# Altium schematic symbol library AliPadash.SchLib: 1186 symbols (part 3 of 6) (continued)
## LA7221 (continued)
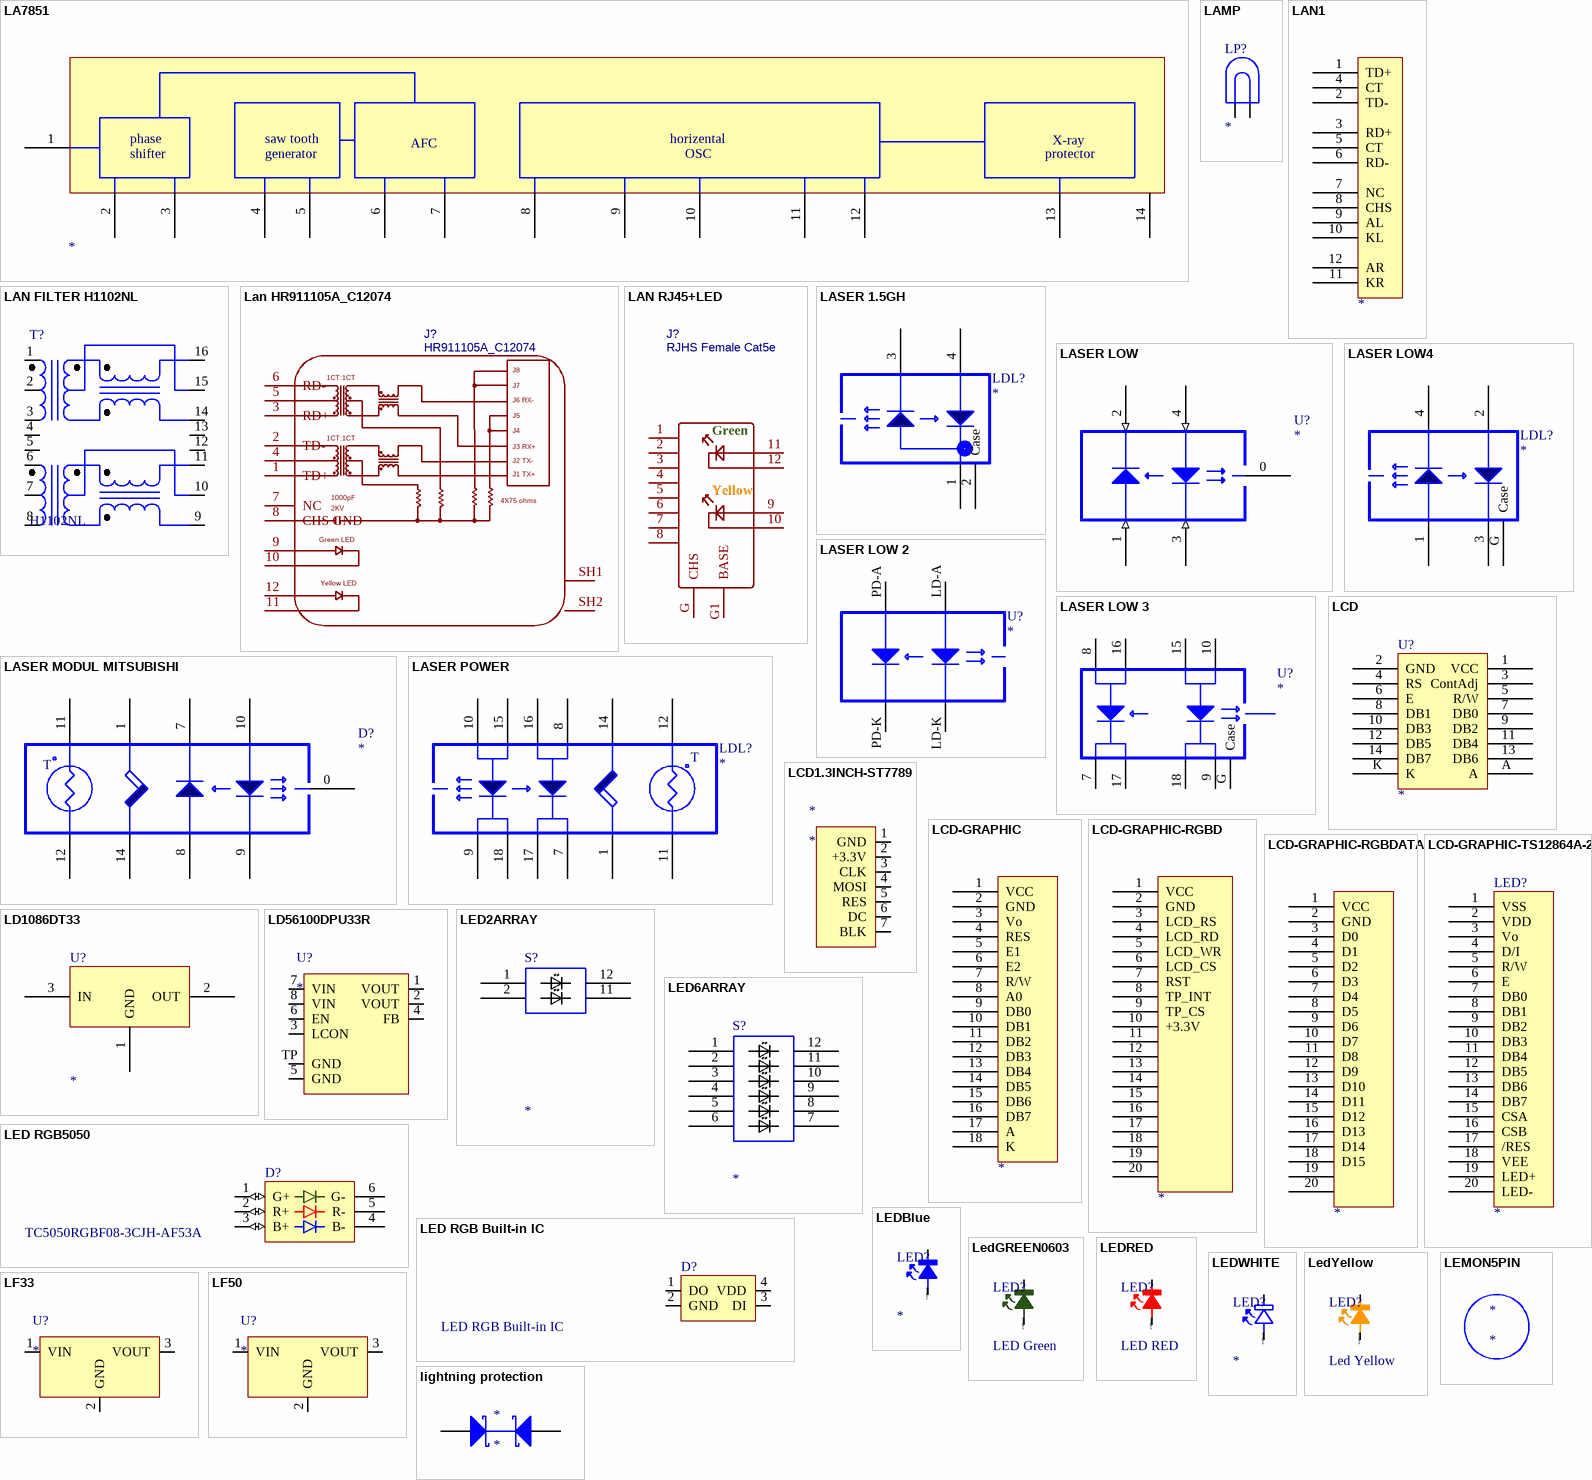
[diagram p37: symbols LA7851 to lightning protection]

## LA7851
designator ?
pins: 1, 2, 3, 4, 5, 6, 7, 8, 9, 10, 11, 12, 13, 14
text: phase; saw tooth; horizental; X-ray; AFC; shifter; generator; OSC; protector

## LAMP
designator LP?
pins: 1, 2

## LAN1
designator ?
pins: 1 TD+, 2 TD-, 3 RD+, 4 CT, 5 CT, 6 RD-, 7 NC, 8 CHS, 9 AL, 10 KL, 11 KR, 12 AR

## LAN FILTER H1102NL
designator T?, comment H1102NL
MAFC: H1102NLT; JLC: C18584
footprint 10-100TRANS
pins: 1, 2, 3, 4, 5, 6, 7, 8, 9, 10, 11, 12, 13, 14, 15, 16

## Lan HR911105A_C12074
designator J?, comment HR911105A_C12074
Manufacturer: HANRUN(汉仁); Supplier: LCSC; Manufacturer Part: HR911105A; Supplier Part: C12074; JLCPCB Part Class: Extended Part; spicePre: J; spiceSymbolName: HR911105A_C12074; JLC: C12074; MAFC: HR911105A
footprint RJ45-TH_HR911105A (Footprint not found)
pins: 1 TD+, 2 TD-, 3 RD+, 4, 5, 6 RD-, 7 NC, 8 CHS GND, 9, 10, 11, 12, SH1, SH2
text: J8; 1CT:1CT; J7; J6 RX-; J5; J4; J3 RX+; J2 TX-; J1 TX+; 1000pF; 4X75 ohms; 2KV; Green LED; Yellow LED

## LAN RJ45+LED
designator J?, comment RJHS Female Cat5e
Manufacturer: CONNFLY; Manufacturer Part: DS1128-09-S8B8X; Supplier: LCSC; Supplier Part: C86578; JLCPCB Part Class: Extended Part; spicePre: R; spiceSymbolName: DS1128-09-S8B8X; MAFC: DS1128-09-S8B8X; JLC: C86578
footprint RJ45+LED1
pins: 1, 2, 3, 4, 5, 6, 7, 8, 9, 10, 11, 12, G CHS, G1 BASE
text: Green; Yellow

## LASER 1.5GH
designator LDL?
footprint LDHP2
pins: 1, 2 Case, 3, 4

## LASER LOW
designator U?
pins: 0, 1 PA (in), 2 PH-K (in), 3 KATODE (in), 4 ANODE (in)

## LASER LOW4
designator LDL?
footprint LDHP2
pins: 1, 2, 3, 4, G Case

## LASER LOW 2
designator U?
pins: LD-A, LD-K, PD-A, PD-K

## LASER LOW 3
designator U?
pins: 7, 8, 9, 10, 15 LD-A, 16 PD-K, 17 PD-A, 18 LD-K, G Case

## LASER MODUL MITSUBISHI
designator D?
pins: 0, 1 +COLLER, 7 CATHODE PH.DET, 8 ANODE PH.DET, 9 CATHODE LASER, 10 ANODE LASER, 11 TERMISTOR, 12 TERMISTOR, 14 -COLLER
text: T

## LASER POWER
designator LDL?
pins: 1, 7, 8, 9, 10, 11, 12, 14, 15, 16, 17, 18
text: T

## LCD
designator U?
footprint LCD1
pins: 1 VCC, 2 GND, 3 ContAdj, 4 RS, 5 R/W, 6 E, 7 DB0, 8 DB1, 9 DB2, 10 DB3, 11 DB4, 12 DB5, 13 DB6, 14 DB7, A, K

## LCD1.3INCH-ST7789
designator *
footprint LCD1.3INCHST7789
pins: 1 GND, 2 +3.3V, 3 CLK, 4 MOSI, 5 RES, 6 DC, 7 BLK

## LCD-GRAPHIC
designator ?
pins: 1 VCC, 2 GND, 3 Vo, 4 RES, 5 E1, 6 E2, 7 R/W, 8 A0, 9 DB0, 10 DB1, 11 DB2, 12 DB3, 13 DB4, 14 DB5, 15 DB6, 16 DB7, 17 A, 18 K

## LCD-GRAPHIC-RGBD
designator ?
pins: 1 VCC, 2 GND, 3 LCD_RS, 4 LCD_RD, 5 LCD_WR, 6 LCD_CS, 7 RST, 8 TP_INT, 9 TP_CS, 10 +3.3V, 11, 12, 13, 14, 15, 16, 17, 18, 19, 20

## LCD-GRAPHIC-RGBDATA
designator ?
pins: 1 VCC, 2 GND, 3 D0, 4 D1, 5 D2, 6 D3, 7 D4, 8 D5, 9 D6, 10 D7, 11 D8, 12 D9, 13 D10, 14 D11, 15 D12, 16 D13, 17 D14, 18 D15, 19, 20

## LCD-GRAPHIC-TS12864A-2
designator LED?
pins: 1 VSS, 2 VDD, 3 Vo, 4 D/I, 5 R/W, 6 E, 7 DB0, 8 DB1, 9 DB2, 10 DB3, 11 DB4, 12 DB5, 13 DB6, 14 DB7, 15 CSA, 16 CSB, 17 /RES, 18 VEE, 19 LED+, 20 LED-

## LD1086DT33
designator U?
footprint TO-252
pins: 1 GND, 2 OUT, 3 IN

## LD56100DPU33R
designator U?
footprint DFN8 (Footprint not found)
pins: 1 VOUT, 2 VOUT, 3 LCON, 4 FB, 5 GND, 6 EN, 7 VIN, 8 VIN, TP GND

## LED2ARRAY
designator S?
pins: 1 A1, 2 A2, 11 B2, 12 B1

## LED6ARRAY
designator S?
pins: 1 A1, 2 A2, 3 A3, 4 A4, 5 A5, 6 A6, 7 B6, 8 B5, 9 B4, 10 B3, 11 B2, 12 B1

## LED RGB5050
designator D?, comment TC5050RGBF08-3CJH-AF53A
Addressable Lighting - 1 LED Discrete PWM Red, Green, Blue (RGB) 5.00mm L x 5.00mm W; MF: SparkFun Electronics; Check_prices: https://www.snapeda.com/parts/5050RGB/SparkFun+Electronics/view-part/?ref=eda; SnapEDA_Link: https://www.snapeda.com/parts/5050RGB/SparkFun+Electronics/view-part/?ref=snap; Availability: Not in stock; Value: *; Price: None; MP: 5050RGB; Package: SparkFun Electronics; JLC: C784540; MFAC: TC5050RGBF08-3CJH-AF53A
footprint LED6-SMD-5050
pins: 1 G+ (io), 2 R+ (io), 3 B+ (io), 4 B-, 5 R-, 6 G-

## LED RGB Built-in IC
designator D?
MFAC: WS2812B-2020; JLC: C965555
footprint LED-SMD_4P-L2.0-W2.0-TL_WS2812B-2020 (Footprint not found)
pins: 1 DO, 2 GND, 3 DI, 4 VDD

## LEDBlue
designator LED?
MFAC: XL-1608UBC-04; JLC: C965807
footprint LED0603B
footprint LED1R3
pins: A, K
text: @DesignPCB

## LedGREEN0603
designator LED?, comment LED Green
MFAC: XL-1608SYGC-06; JLC: C965805
footprint LEDR-2
footprint LED1R3
footprint LED0603G (Footprint not found)
pins: A, K
text: @DesignPCB

## LEDRED
designator LED?, comment LED RED
MFAC: KT-0603R; JLC: C2286
footprint LED0603R
footprint LED1R3
pins: A, K
text: @DesignPCB

## LEDWHITE
designator LED?
MFAC: KT-0603W; JLC: C2290
footprint LED0805w
footprint LED1R3
pins: A, K
text: @DesignPCB

## LedYellow
designator LED?, comment Led Yellow
MFAC: XL-1608UWC-04; JLC: C965808
footprint LED0805Y
footprint LED1R3
footprint LED0603Y (Footprint not found)
pins: A, K
text: @DesignPCB

## LEMON5PIN
designator *

## LF33
designator U?
footprint DPAK228P972X240-3N (Footprint not found)
pins: 1 VIN, 2 GND, 3 VOUT

## LF50
designator U?
footprint DPAK228P972X240-3N (Footprint not found)
pins: 1 VIN, 2 GND, 3 VOUT

## lightning protection
designator *
pins: 1 A1, 2 A2

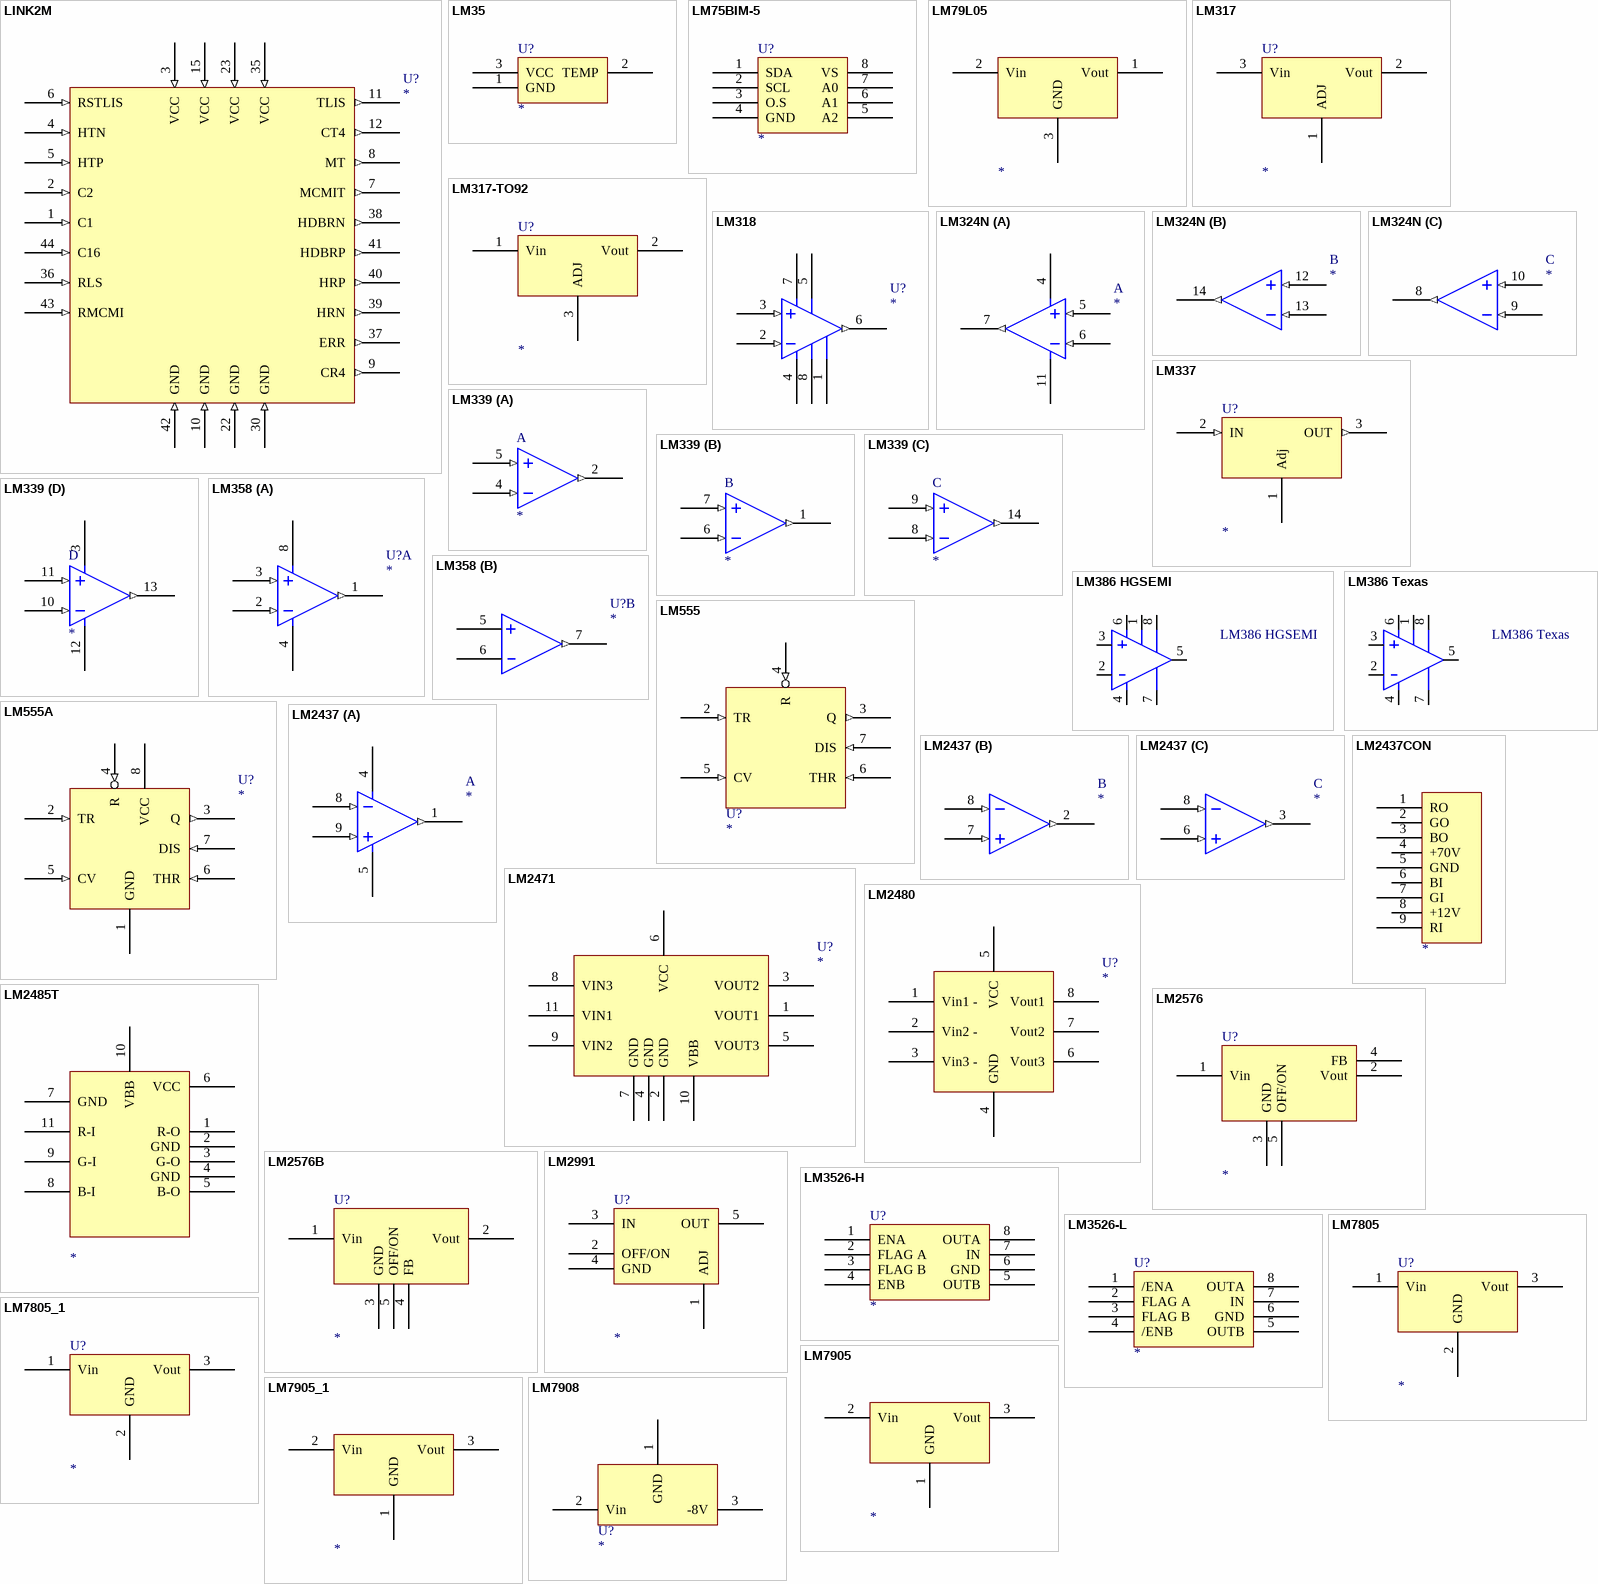
[diagram p38: symbols LINK2M to LM7908]

## LINK2M
designator U?
pins: 1 C1 (in), 2 C2 (in), 3 VCC (in), 4 HTN (in), 5 HTP (in), 6 RSTLIS (in), 7 MCMIT (out), 8 MT (out), 9 CR4 (out), 10 GND (in), 11 TLIS (out), 12 CT4 (out), 15 VCC (in), 22 GND (in), 23 VCC (in), 30 GND (in), 35 VCC (in), 36 RLS (in), 37 ERR (out), 38 HDBRN (out), 39 HRN (out), 40 HRP (out), 41 HDBRP (out), 42 GND (in), 43 RMCMI (in), 44 C16 (in)

## LM35
designator U?
footprint TO-92
pins: 1 GND, 2 TEMP, 3 VCC

## LM75BIM-5
designator U?
footprint SO-8
pins: 1 SDA, 2 SCL, 3 O.S, 4 GND, 5 A2, 6 A1, 7 A0, 8 VS

## LM79L05
designator ?
pins: 1 Vout, 2 Vin, 3 GND

## LM317
designator U?
footprint TO-220A
pins: 1 ADJ, 2 Vout, 3 Vin

## LM317-TO92
designator U?
footprint TO-92
pins: 1 Vin, 2 Vout, 3 ADJ

## LM318
designator U?
pins: 1 COMP3, 2 -IN (in), 3 +IN (in), 4 V-, 5 COMP1, 6 OUT (out), 7 V+, 8 COMP2

## LM324N
designator ?
part A pins: 4 V+, 5 Q1 (in), 6 Q2 (in), 7 D1 (out), 11 V-
part B pins: 12 Q1 (in), 13 Q2 (in), 14 D1 (out)
part C pins: 8 D1 (out), 9 Q2 (in), 10 (in)

## LM337
designator U?
pins: 1 Adj, 2 IN (in), 3 OUT (out)

## LM339
designator ?
part A pins: 2 OUT (out), 4 -IN (in), 5 +IN (in)
part B pins: 1 OUT (out), 6 -IN (in), 7 +IN (in)
part C pins: 8 -IN (in), 9 +IN (in), 14 OUT (out)
part D pins: 3 V-, 10 -IN (in), 11 +IN (in), 12 V+, 13 OUT (out)

## LM358
designator U?
MFAC: LM358DR; jlc: C5423
footprint SO-8
footprint DIP8
part A pins: 1 OUT (out), 2 -IN (in), 3 +IN (in), 4 V+, 8 V-
part B pins: 5, 6, 7 OUT (out)

## LM386 HGSEMI
designator ?
MFAC: LM386M-1/TR; JLC: C383071
footprint SO-8
pins: 1, 2, 3, 4, 5, 6, 7, 8

## LM386 Texas
designator ?
MFAC: LM386MX-1/NOPB; JLC: C23573
footprint SO-8
pins: 1, 2, 3, 4, 5, 6, 7, 8

## LM555
designator U?
pins: 1 GND (power) hidden to GND, 2 TR (in), 3 Q (out), 4 R (in), 5 CV (in), 6 THR (in), 7 DIS (in), 8 VCC (power) hidden to VCC

## LM555A
designator U?
pins: 1 GND (power), 2 TR (in), 3 Q (out), 4 R (in), 5 CV (in), 6 THR (in), 7 DIS (in), 8 VCC (power)

## LM2437
designator ?
part A pins: 1 D1 (out), 4 V-, 5 V+, 8 Q2 (in), 9 Q1 (in)
part B pins: 2 D1 (out), 7 Q1 (in), 8 Q2 (in)
part C pins: 3 D1 (out), 6 Q1 (in), 8 Q2 (in)

## LM2437CON
designator ?
pins: 1 RO, 2 GO, 3 BO, 4 +70V, 5 GND, 6 BI, 7 GI, 8 +12V, 9 RI

## LM2471
designator U?
pins: 1 VOUT1, 2 GND, 3 VOUT2, 4 GND, 5 VOUT3, 6 VCC, 7 GND, 8 VIN3, 9 VIN2, 10 VBB, 11 VIN1

## LM2480
designator U?
pins: 1 Vin1 -, 2 Vin2 -, 3 Vin3 -, 4 GND, 5 VCC, 6 Vout3, 7 Vout2, 8 Vout1

## LM2485T
designator ?
pins: 1 R-O, 2 GND, 3 G-O, 4 GND, 5 B-O, 6 VCC, 7 GND, 8 B-I, 9 G-I, 10 VBB, 11 R-I

## LM2576
designator U?
footprint TO-220F-5L
pins: 1 Vin, 2 Vout, 3 GND, 4 FB, 5 OFF/ON

## LM2576B
designator U?
footprint TO-220F-5L
pins: 1 Vin, 2 Vout, 3 GND, 4 FB, 5 OFF/ON

## LM2991
designator U?
footprint TO-220F-5L
pins: 1 ADJ, 2 OFF/ON, 3 IN, 4 GND, 5 OUT

## LM3526-H
designator U?
footprint SO-8
pins: 1 ENA, 2 FLAG A, 3 FLAG B, 4 ENB, 5 OUTB, 6 GND, 7 IN, 8 OUTA

## LM3526-L
designator U?
footprint SO-8
pins: 1 /ENA, 2 FLAG A, 3 FLAG B, 4 /ENB, 5 OUTB, 6 GND, 7 IN, 8 OUTA

## LM7805
designator U?
footprint TO-92
footprint TO-220A
footprint TO-220
pins: 1 Vin, 2 GND, 3 Vout

## LM7805_1
designator U?
footprint TO-92
footprint TO-220
footprint TO-220A
footprint TO-3
pins: 1 Vin, 2 GND, 3 Vout

## LM7905
designator ?
pins: 1 GND, 2 Vin, 3 Vout

## LM7905_1
designator ?
pins: 1 GND, 2 Vin, 3 Vout

## LM7908
designator U?
footprint TO220
pins: 1 GND, 2 Vin, 3 -8V
